# Altium footprint library MyPCB_Homework.PcbLib: 62 footprints (part 2 of 4)
Each footprint in its own frame and in the unit in brackets; x right, y up, seen from the top. Pads: shape width x height; smd on the part's side, far side on the other; paste and mask are expansions set on the pad; w line width, h text height; cw(c..) or ccw(c..) is an arc to the next point about the centre after c.
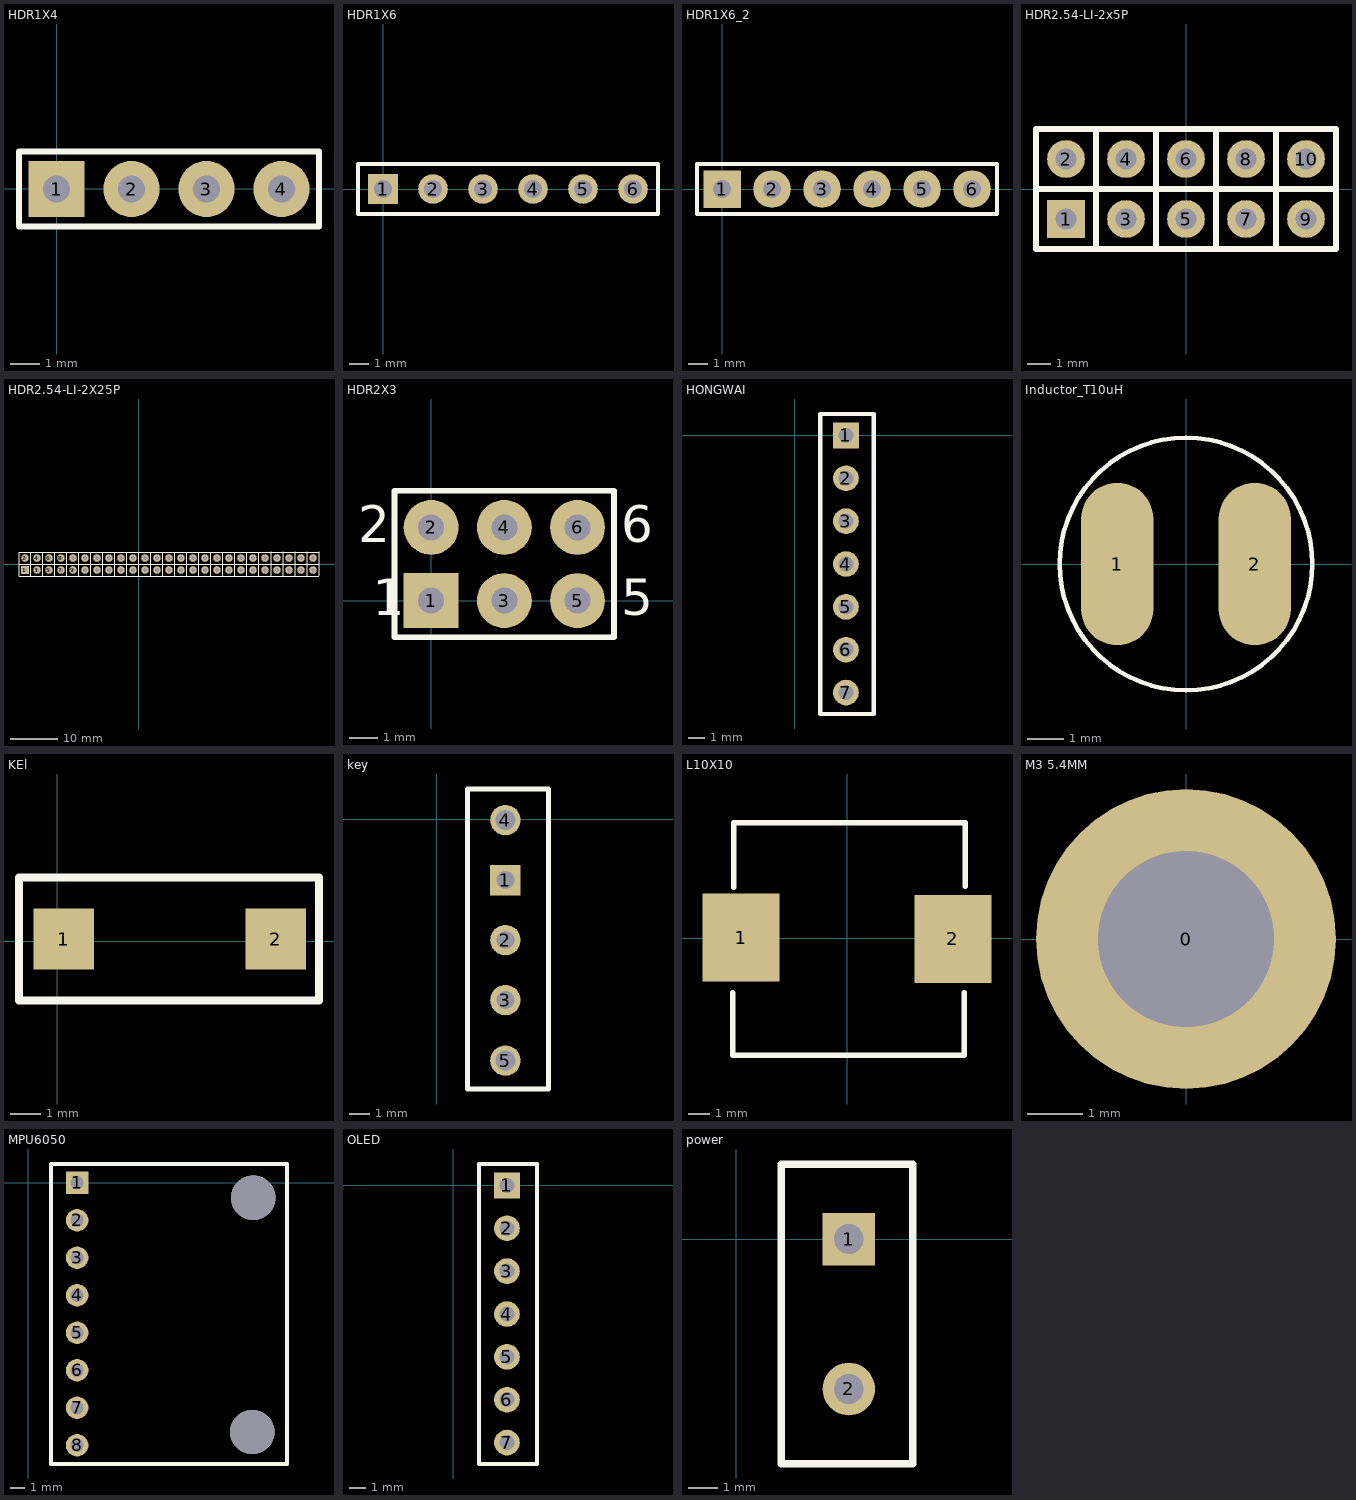
[diagram p1: the footprints below, top view; thin cyan lines are the x and y axes]

## HDR1X4 [mm]
pads (4):
  rect 1.905x1.905 hole 0.9: 1(0,0)
  round 1.905 hole 0.9: 2(2.54,0) 3(5.08,0) 4(7.62,0)
Top Overlay:
  lines w0.2: -1.27,-1.27 -1.27,1.27 8.89,1.27 8.89,-1.27 -1.27,-1.27

## HDR1X6 [mm] "Connector; Header; 6 Position"
pads (6):
  rect 1.5x1.5 hole 0.9: 1(0,0)
  round 1.5 hole 0.9: 2(2.54,0) 3(5.08,0) 4(7.62,0) 5(10.16,0) 6(12.7,0)
Top Overlay:
  lines w0.2: -1.27,-1.27 -1.27,1.27 13.97,1.27 13.97,-1.27 -1.27,-1.27

## HDR1X6_2 [mm]
pads (6):
  rect 1.905x1.905 hole 0.9: 1(0,0)
  round 1.905 hole 0.9: 2(2.54,0) 3(5.08,0) 4(7.62,0) 5(10.16,0) 6(12.7,0)
Top Overlay:
  lines w0.2: -1.27,-1.27 13.97,-1.27 13.97,1.27 -1.27,1.27 -1.27,-1.27

## HDR2.54-LI-2x5P [mm] "双排排针，5x2脚"
pads (10):
  rect 1.6x1.6 hole 0.9: 1(-5.08,-1.27)
  round 1.6 hole 0.9: 2(-5.08,1.27) 3(-2.54,-1.27) 4(-2.54,1.27) 5(0,-1.27) 6(0,1.27) 7(2.54,-1.27) 8(2.54,1.27) 9(5.08,-1.27) 10(5.08,1.27)
Top Overlay:
  lines w0.254: -6.35,0 6.35,0 ; -3.81,-2.54 -3.81,2.54 ; -1.27,-2.54 -1.27,2.54 ; 1.27,-2.54 1.27,2.54 ; 3.81,-2.54 3.81,2.54 ; 6.35,-2.54 6.35,2.54 ; 6.35,-2.54 -6.35,-2.54 -6.35,2.54 6.35,2.54 ; 6.35,-2.54 6.35,2.54
3D body "HDR2.54-1x2P.STEP": height 8.5, standoff -3, extent -1.27,-2.54 1.27,2.54
3D body "HDR2.54-1x2P.STEP": height 8.5, standoff -3, extent 1.27,-2.54 3.81,2.54
3D body "HDR2.54-1x2P.STEP": height 8.5, standoff -3, extent -6.35,-2.54 -3.81,2.54
3D body "HDR2.54-1x2P.STEP": height 8.5, standoff -3, extent -3.81,-2.54 -1.27,2.54
3D body "HDR2.54-1x2P.STEP": height 8.5, standoff -3, extent 3.81,-2.54 6.35,2.54

## HDR2.54-LI-2X25P [mm] "双排排针，25x2脚"
pads (50):
  rect 1.6x1.6 hole 0.9: 1(-24.13,-1.27)
  round 1.6 hole 0.9: 2(-24.13,1.27) 3(-21.59,-1.27) 4(-21.59,1.27) 5(-19.05,-1.27) 6(-19.05,1.27) 7(-16.51,-1.27) 8(-16.51,1.27) 9(-13.97,-1.27) 10(-13.97,1.27) 11(-11.43,-1.27) 12(-11.43,1.27) 13(-8.89,-1.27) 14(-8.89,1.27) 15(-6.35,-1.27) 16(-6.35,1.27) 17(-3.81,-1.27) 18(-3.81,1.27) 19(-1.27,-1.27) 20(-1.27,1.27) 21(1.27,-1.27) 22(1.27,1.27) 23(3.81,-1.27) 24(3.81,1.27) 25(6.35,-1.27) 26(6.35,1.27) 27(8.89,-1.27) 28(8.89,1.27) 29(11.43,-1.27) 30(11.43,1.27) 31(13.97,-1.27) 32(13.97,1.27) 33(16.51,-1.27) 34(16.51,1.27) 35(19.05,-1.27) 36(19.05,1.27) 37(21.59,-1.27) 38(21.59,1.27) 39(24.13,-1.27) 40(24.13,1.27) 41(26.67,-1.27) 42(26.67,1.27) 43(29.21,-1.27) 44(29.21,1.27) 45(31.75,-1.27) 46(31.75,1.27) 47(34.29,-1.27) 48(34.29,1.27) 49(36.83,-1.27) 50(36.83,1.27)
Top Overlay:
  lines w0.2: 38.1,-2.54 -25.4,-2.54 -25.4,2.54 38.1,2.54
  lines w0.203: -25.4,0 38.1,0 ; -22.86,-2.54 -22.86,2.54 ; -20.32,-2.54 -20.32,2.54 ; -17.78,-2.54 -17.78,2.54 ; -15.24,-2.54 -15.24,2.54 ; -12.7,-2.54 -12.7,2.54 ; -10.16,-2.54 -10.16,2.54 ; -7.62,-2.54 -7.62,2.54 ; -5.08,-2.54 -5.08,2.54 ; -2.54,-2.54 -2.54,2.54 ; 0,-2.54 0,2.54 ; 2.54,-2.54 2.54,2.54 ; 5.08,-2.54 5.08,2.54 ; 7.62,-2.54 7.62,2.54 ; 10.16,-2.54 10.16,2.54 ; 12.7,-2.54 12.7,2.54 ; 15.24,-2.54 15.24,2.54 ; 17.78,-2.54 17.78,2.54 ; 20.32,-2.54 20.32,2.54 ; 22.86,-2.54 22.86,2.54 ; 25.4,-2.54 25.4,2.54 ; 27.94,-2.54 27.94,2.54 ; 30.48,-2.54 30.48,2.54 ; 33.02,-2.54 33.02,2.54 ; 35.56,-2.54 35.56,2.54 ; 38.1,-2.54 38.1,2.54
3D body "HDR2.54-1x2P.STEP": height 8.5, standoff -3, extent 33.02,-2.54 35.56,2.54
3D body "HDR2.54-1x2P.STEP": height 8.5, standoff -3, extent 25.4,-2.54 27.94,2.54
3D body "HDR2.54-1x2P.STEP": height 8.5, standoff -3, extent 30.48,-2.54 33.02,2.54
3D body "HDR2.54-1x2P.STEP": height 8.5, standoff -3, extent 27.94,-2.54 30.48,2.54
3D body "HDR2.54-1x2P.STEP": height 8.5, standoff -3, extent 35.56,-2.54 38.1,2.54
3D body "HDR2.54-1x2P.STEP": height 8.5, standoff -3, extent 17.78,-2.54 20.32,2.54
3D body "HDR2.54-1x2P.STEP": height 8.5, standoff -3, extent 20.32,-2.54 22.86,2.54
3D body "HDR2.54-1x2P.STEP": height 8.5, standoff -3, extent 12.7,-2.54 15.24,2.54
3D body "HDR2.54-1x2P.STEP": height 8.5, standoff -3, extent 15.24,-2.54 17.78,2.54
3D body "HDR2.54-1x2P.STEP": height 8.5, standoff -3, extent 22.86,-2.54 25.4,2.54
3D body "HDR2.54-1x2P.STEP": height 8.5, standoff -3, extent 5.08,-2.54 7.62,2.54
3D body "HDR2.54-1x2P.STEP": height 8.5, standoff -3, extent 7.62,-2.54 10.16,2.54
3D body "HDR2.54-1x2P.STEP": height 8.5, standoff -3, extent 0,-2.54 2.54,2.54
3D body "HDR2.54-1x2P.STEP": height 8.5, standoff -3, extent 2.54,-2.54 5.08,2.54
3D body "HDR2.54-1x2P.STEP": height 8.5, standoff -3, extent 10.16,-2.54 12.7,2.54
3D body "HDR2.54-1x2P.STEP": height 8.5, standoff -3, extent -7.62,-2.54 -5.08,2.54
3D body "HDR2.54-1x2P.STEP": height 8.5, standoff -3, extent -5.08,-2.54 -2.54,2.54
3D body "HDR2.54-1x2P.STEP": height 8.5, standoff -3, extent -12.7,-2.54 -10.16,2.54
3D body "HDR2.54-1x2P.STEP": height 8.5, standoff -3, extent -10.16,-2.54 -7.62,2.54
3D body "HDR2.54-1x2P.STEP": height 8.5, standoff -3, extent -2.54,-2.54 0,2.54
3D body "HDR2.54-1x2P.STEP": height 8.5, standoff -3, extent -20.32,-2.54 -17.78,2.54
3D body "HDR2.54-1x2P.STEP": height 8.5, standoff -3, extent -17.78,-2.54 -15.24,2.54
3D body "HDR2.54-1x2P.STEP": height 8.5, standoff -3, extent -25.4,-2.54 -22.86,2.54
3D body "HDR2.54-1x2P.STEP": height 8.5, standoff -3, extent -22.86,-2.54 -20.32,2.54
3D body "HDR2.54-1x2P.STEP": height 8.5, standoff -3, extent -15.24,-2.54 -12.7,2.54

## HDR2X3 [mm]
pads (6):
  rect 1.905x1.905 hole 0.9: 1(0,0)
  round 1.905 hole 0.9: 2(0,2.54) 3(2.54,0) 4(2.54,2.54) 5(5.08,0) 6(5.08,2.54)
Top Overlay:
  lines w0.2: 1.482,-1.27 6.35,-1.27 ; 6.35,-1.27 -1.27,-1.27 -1.27,3.81 6.35,3.81 6.35,-1.27
  text "1" at -2.032,-0.508 h1.27
  text "2" at -2.54,2.032 h1.27
  text "5" at 6.604,-0.508 h1.27
  text "6" at 6.604,2.032 h1.27

## HONGWAI [mil]
pads (7):
  rect 60x60 hole 35: 1(120,0)
  round 60 hole 35: 2(120,-100) 3(120,-200) 4(120,-300) 5(120,-400) 6(120,-500) 7(120,-600)
Top Overlay:
  lines w10: 60,-650 60,50 185,50 185,-650 60,-650

## Inductor_T10uH [mm]
pads (2):
  oval 2x4.5 smd: 1(-1.905,0) 2(1.905,0)
Top Overlay:
  circle w0.127: c0,0 r3.5
3D body: height 6.35, standoff 5.08, extent -3.499,-3.499 3.499,3.499
3D body: height 5.08, standoff 1.27, extent -2.793,-2.793 2.54,2.54
3D body: height 1.27, standoff 0, extent -3.499,-3.499 3.499,3.499

## KEl [mm]
pads (2):
  rect 2x2 smd: 1(0.204,0.077) 2(7.204,0.077)
Top Overlay:
  lines w0.254: -1.27,-1.955 -1.27,2.109 8.636,2.109 8.636,-1.955 -1.27,-1.955

## key [mil]
pads (5):
  rect 60x60 hole 35: 1(135,-120)
  round 60 hole 35: 2(135,-238) 3(135,-356)
  round 60 hole 39.37: 4(135,-2) 5(135,-475)
Top Overlay:
  lines w10: 60,-531 220,-531 220,59 60,59 60,-531

## L10X10 [mil]
pads (2):
  rect 140x160 smd: 1(-192.08,1.25) 2(192.08,-1.25)
Top Overlay:
  lines w10: -207.08,-98.75 -207.08,-212.08 212.92,-212.08 212.92,-98.75 ; -205.42,92.92 -205.42,209.58 214.58,209.58 214.58,94.58
3D body: height 157.48, standoff 0, extent -207,-213 215,211

## M3 5.4MM [mm] "M3螺丝孔，"
pads (1):
  round 5.4 hole 3.175: 0(0,0)
Top Overlay:
  circle w0.1: c0,0 r2.2
  lines w0.1: -1.562,-1.562 0,0 ; -1.549,1.549 0,0 ; 1.537,1.537 0,0 ; 1.562,-1.562 0,0

## MPU6050 [mil]
pads (8):
  rect 60x60 hole 35: 1(130,0)
  round 60 hole 35: 2(130,-100) 3(130,-200) 4(130,-300) 5(130,-400) 6(130,-500) 7(130,-600) 8(130,-700)
via 596.7,-665 diameter 118 hole 118
via 599.57,-40 diameter 118 hole 118
Top Overlay:
  lines w10: 60,-750 60,50 690,50 690,-750 60,-750

## OLED [mil]
pads (7):
  rect 60x60 hole 35: 1(125,0)
  round 60 hole 35: 2(125,-100) 3(125,-200) 4(125,-300) 5(125,-400) 6(125,-500) 7(125,-600)
Top Overlay:
  lines w10: 60,-650 60,50 195,50 195,-650 60,-650

## PCBComponent_1 [mil]

## power [mil]
pads (2):
  rect 70x70 hole 39.37: 1(150,0)
  round 70 hole 39.37: 2(150,-200)
Top Overlay:
  lines w10: 60,-300 60,100 235,100 235,-300 60,-300